# Altium footprint library ZS-005.PcbLib: 30 footprints (part 1 of 2)
Each footprint in its own frame and in the unit in brackets; x right, y up, seen from the top. Pads: shape width x height; smd on the part's side, far side on the other; paste and mask are expansions set on the pad; w line width, h text height; cw(c..) or ccw(c..) is an arc to the next point about the centre after c.
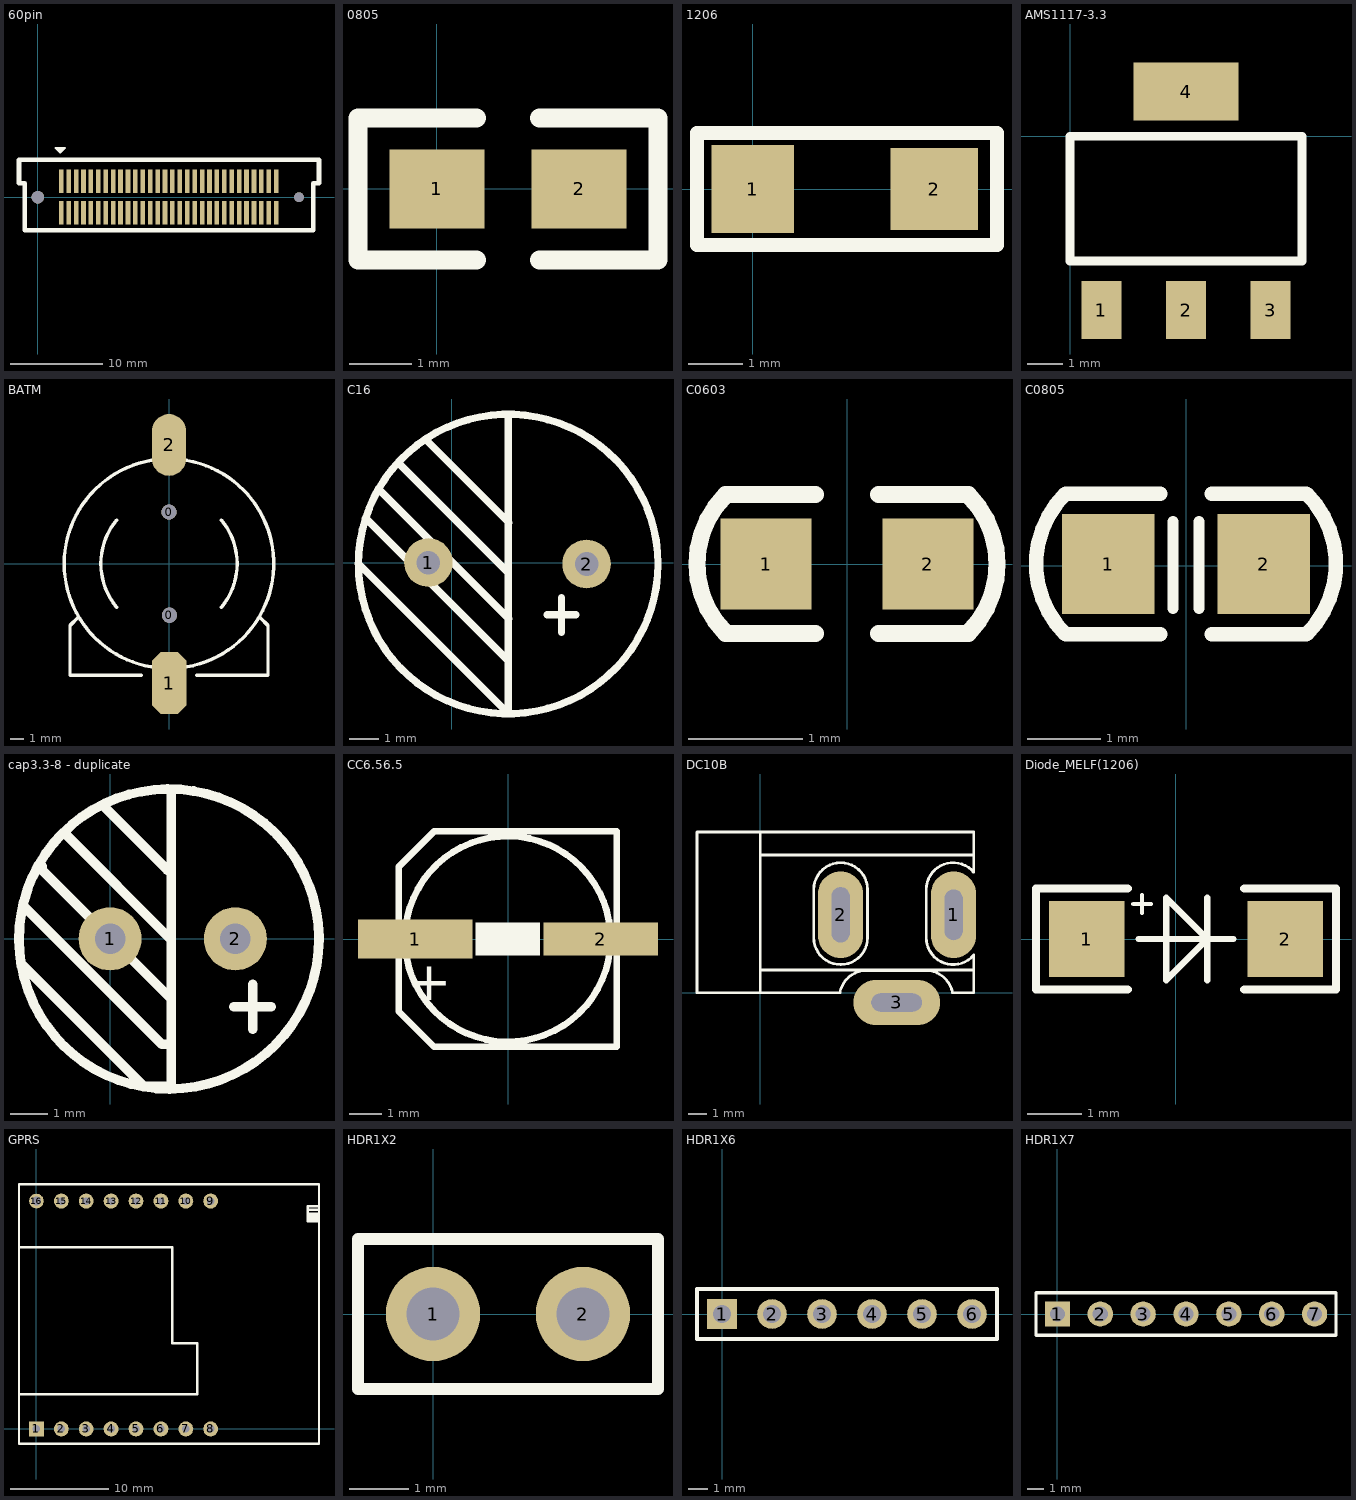
[diagram p0: the footprints below, top view; thin cyan lines are the x and y axes]

## 60pin [mm]
pads (62):
  rect 0.5x2.54 smd: 1(2.53,1.727) 2(3.33,1.727) 3(4.13,1.727) 4(4.93,1.727) 5(5.73,1.727) 6(6.53,1.727) 7(7.33,1.727) 8(8.13,1.727) 9(8.93,1.727) 10(9.73,1.727) 11(10.53,1.727) 12(11.33,1.727) 13(12.13,1.727) 14(12.93,1.727) 15(13.73,1.727) 16(14.53,1.727) 17(15.33,1.727) 18(16.13,1.727) 19(16.93,1.727) 20(17.73,1.727) 21(18.53,1.727) 22(19.33,1.727) 23(20.13,1.727) 24(20.93,1.727) 25(21.73,1.727) 26(22.53,1.727) 27(23.33,1.727) 28(24.13,1.727) 29(24.93,1.727) 30(25.73,1.727) 31(25.73,-1.65) 32(24.93,-1.65) 33(24.13,-1.65) 34(23.33,-1.65) 35(22.53,-1.65) 36(21.73,-1.65) 37(20.93,-1.65) 38(20.13,-1.65) 39(19.33,-1.65) 40(18.53,-1.65) 41(17.73,-1.65) 42(16.93,-1.65) 43(16.13,-1.65) 44(15.33,-1.65) 45(14.53,-1.65) 46(13.73,-1.65) 47(12.93,-1.65) 48(12.13,-1.65) 49(11.33,-1.65) 50(10.53,-1.65) 51(9.73,-1.65) 52(8.93,-1.65) 53(8.13,-1.65) 54(7.33,-1.65) 55(6.53,-1.65) 56(5.73,-1.65) 57(4.93,-1.65) 58(4.13,-1.65) 59(3.33,-1.65) 60(2.53,-1.65)
  round 1.35 hole 1.35: ""(0,0)
  round 1.05 hole 1.05: ""(28.194,0)
Top Overlay:
  lines w0.2: 1.88,5.334 2.413,4.801 2.946,5.334 1.88,5.334
  lines w0.254: 2.553,5.042 2.324,5.042 2.172,5.194 2.68,5.194
  lines w0.5: -2.032,1.524 -1.397,1.524 -1.397,-3.556 29.718,-3.556 29.718,1.524 30.353,1.524 30.353,4.064 27.178,4.064 1.143,4.064 -2.032,4.064 -2.032,1.524

## 0805 [mil]
pads (2):
  rect 60x50 smd: 1(0,-0.06) 2(90,-0.06)
Top Overlay:
  lines w12: 25,-45.06 -50,-45.06 -50,44.94 25,44.94 ; 65,-45.06 140,-45.06 140,44.94 65,44.94

## 1206 [mm]
pads (2):
  rect 1.5x1.6 smd: 1(0,0)
  rect 1.6x1.5 smd: 2(3.302,0)
Top Overlay:
  lines w0.254: -1.016,-1.016 -1.016,1.016 4.445,1.016 4.445,-1.016 -1.016,-1.016

## AMS1117-3.3 [mm]
pads (4):
  rect 1.14x1.65 smd: 1(0.889,-4.953) 2(3.302,-4.953) 3(5.715,-4.953)
  rect 3x1.65 smd: 4(3.302,1.27)
Top Overlay:
  lines w0.254: 0,-3.556 0,0 6.604,0 6.604,-3.556 0,-3.556

## BATM [mm]
pads (4):
  round 1.1 hole 1.1 unplated: 0(0,3.748) 0(0.025,-3.752)
  oct 2.5x4.5 smd: 1(0.025,-8.687)
  oval 2.5x4.5 smd: 2(0,8.636)
Top Overlay:
  lines w0.25: -6.6,-3.902 -7.2,-4.502 -7.2,-8.128 -2,-8.128 ; -3.815,-3.171 cw(c0,-0.002) -3.812,3.171 ; -0.833,-7.576 cw(c0,-0.002) -7.62,-0.002 cw(c0,-0.002) -0.833,7.573 ; 0.833,-7.576 ccw(c0,-0.002) 0.833,7.573 ; 2,-8.128 7.2,-8.128 7.2,-4.502 6.625,-3.927 ; 3.81,-3.177 ccw(c0,-0.002) 3.812,3.171
3D body "User Library-cr1220.STEP": height 4.44, standoff -0.5, extent -7.493,-9.504 7.504,8.996

## C16 [mil]
pads (2):
  round 66 hole 32: 1(-31.5,0) 2(183.07,-1.97)
Top Overlay:
  circle w10: c76.77,-1.97 r203.15
  lines w10: -126.97,-0.98 76.77,-204.72 76.77,-13.77 ; -115.6,59.6 76.33,-132.33 ; -97.93,98.93 77.27,-76.27 ; -69.88,132.88 76.77,-13.77 ; -33.41,165.41 77.81,54.19 ; 76.77,198.82 76.77,144.23 76.77,-13.77 ; 129.31,-71 168.69,-71 ; 149,-47.38 149,-94.62 149,-71 152.94,-71

## C0603 [mm]
pads (2):
  rect 0.8x0.8 smd: 1(-0.711,0) 2(0.711,0)
Top Overlay:
  lines w0.15: -0.279,-0.61 -1.067,-0.61 cw(c-0.457,0) -1.067,0.61 -0.279,0.61 ; 0.279,-0.61 1.067,-0.61 ccw(c0.457,0) 1.067,0.61 0.279,0.61
3D body "0603_C.step": height 0.88, standoff 0, extent -0.8,-0.406 0.8,0.404

## C0805 [mil]
pads (2):
  rect 50x54 smd: 1(-42,1) 2(42,1)
Top Overlay:
  lines w5.91: -7,-23 -7,24 ; 7,-23 7,24
  lines w7.87: -14,-37 -65,-37 cw(c-27.91,1) -65,39 -14,39 ; 14,-37 65,-37 ccw(c27.91,1) 65,39 14,39
3D body "C0805.STEP": height 19.68, standoff 0, extent -39,-24 39.74,25.21

## cap3.3-8 - duplicate [mil]
pads (2):
  round 66 hole 32: 1(0,0) 2(131.05,0)
Top Overlay:
  lines w10: -92,-27 35,-154 64,-154 64,-1 ; -89,33 54,-110 64,-110 ; -71,76 -71,72 64,-63 ; -47,111 -47,110 64,-1 ; -8,140 60,72 64,72 ; 65,156 64,155 64,-1 ; 129.31,-71 168.69,-71 ; 149,-47.38 149,-94.62 149,-71 152.94,-71 ; 218.47,1.94 ccw(c61.64,-0.14) 218.49,-0.14

## CC6.56.5 [mm]
pads (2):
  rect 3.5x1.2 smd: 1(-2.845,0)
  rect 3.5x1 smd: 2(2.845,0)
Top Overlay:
  rectangle: -0.997,-0.496 0.987,0.5
  lines w0.2: -3.353,-2.21 -2.257,-3.305 3.327,-3.305 3.327,3.309 -2.254,3.309 -3.353,2.21 -3.353,-2.21
  lines w0.203: 2.924,1.156 ccw(c-0.007,0.002) 2.924,1.154
  text "+" at -1.727,-1.88 h1.2
3D body "SL-E.step": height 5.2, standoff 0, extent -3.627,-3.046 3.373,3.554

## DC10B [mm]
pads (3):
  oval 2.5x4.8 hole 1 slot 2.794 at 90 deg: 1(10.693,4.318)
  oval 2.5x4.8 hole 1 slot 3.048 at 90 deg: 2(4.445,4.318)
  oval 4.8x2.5 hole 1 slot 2.794 at 0 deg: 3(7.544,-0.533)
Top Overlay:
  lines w0.152: 0,1.27 11.811,1.27 ; 0,7.62 11.687,7.62 11.792,7.62 ; 0.127,8.89 -0.381,8.89 -3.5,8.89 -3.5,0 0,0 ; 4.293,0 0,0 ; 4.403,0.004 cw(c5.867,-0.254) 5.867,1.232 9.169,1.232 cw(c9.169,-0.254) 10.633,0.004 ; 10.668,0 11.811,0 11.811,2.032 ; 11.807,2.093 cw(c10.668,3.048) 9.182,3.048 9.181,5.715 cw(c10.668,5.715) 11.807,6.67 11.811,8.89 0,8.89 0,0 ; 5.931,5.715 ccw(c4.445,5.715) 2.959,5.715 2.958,3.048 ccw(c4.445,3.048) 5.931,3.048 5.931,5.715 ; 5.931,5.715 5.932,5.715
3D body "User Library-dc range - dc connector[4840_2201].STEP": height 11.02, standoff -3.48, extent -3.038,-0.685 10.788,8.821

## Diode_MELF(1206) [mm]
pads (2):
  rect 1.4x1.4 smd: 1(-1.651,0) 2(2.032,0)
Top Overlay:
  lines w0.076: -0.787,0.648 -0.457,0.648 ; -0.622,0.483 -0.622,0.813
  lines w0.12: -0.686,0 1.067,0 ; 0.584,-0.762 0.584,0.762 ; -0.178,-0.762 0.584,0 -0.178,0.762 -0.178,-0.762
  lines w0.15: -0.889,-0.94 -2.591,-0.94 -2.591,0.94 -0.889,0.94 ; 1.27,-0.94 2.972,-0.94 2.972,0.94 1.27,0.94
3D body "Diode MELF.STEP": height 1.51, standoff 0.01, extent -1.496,-0.75 2.004,0.75

## GPRS [mil]
pads (16):
  rect 60x60 hole 30: 1(0,0)
  round 60 hole 30: 2(100,0) 3(200,0) 4(300,0) 5(400,0) 6(500,0) 7(600,0) 8(700,0) 9(700,915.35) 10(600,915.35) 11(500,915.35) 12(400,915.35) 13(300,915.35) 14(200,915.35) 15(100,915.35)
  round 59.06 hole 35.43: 16(0,915.35)
Top Layer:
  lines w10: 0,0 0,10
Top Overlay:
  lines w10: -70,-60 -70,983.31 ; -70,140 645,140 645,345 545,345 545,730 -70,730 ; -69.72,-60 1135,-60 1135,983.31 -69.72,983.31 ; 1090,845 1135,845 ; 1090,855 1130,855 ; 1090,880 1130,880 ; 1130,865 1090,865 1090,895 ; 1135,885 1135,835 1090,835 1090,895 ; 1135,895 1090,895
3D body "User Library-SIM800C-1.STEP": height 97.38, standoff 5.26, extent -55,130.94 637.92,749.06

## HDR1X2 [mm]
pads (2):
  round 1.6 hole 0.9: 1(0,0) 2(2.54,0)
Top Overlay:
  lines w0.2: -1.27,-1.27 -1.27,1.27 3.81,1.27 3.81,-1.27 -1.27,-1.27
3D body "1001-2.STEP": height 8.54, standoff -3, extent -1.27,-1.27 3.81,1.27

## HDR1X6 [mm] "Connector; Header; 6 Position"
pads (6):
  rect 1.5x1.5 hole 0.9: 1(0,0)
  round 1.5 hole 0.9: 2(2.54,0) 3(5.08,0) 4(7.62,0) 5(10.16,0) 6(12.7,0)
Top Overlay:
  lines w0.2: -1.27,-1.27 -1.27,1.27 13.97,1.27 13.97,-1.27 -1.27,-1.27
3D body "User Library-ESP07-1.STEP": height 3.5, standoff -0.01, extent -1.712,-1.224 14.288,20.776

## HDR1X7 [mm] "Connector; Header; 7 Position"
pads (7):
  rect 1.5x1.5 hole 0.9: 1(0,0)
  round 1.5 hole 0.9: 2(2.54,0) 3(5.08,0) 4(7.62,0) 5(10.16,0) 6(12.7,0) 7(15.24,0)
Top Overlay:
  lines w0.2: -1.27,-1.27 16.51,-1.27 16.51,1.27 -1.27,1.27 -1.27,-1.27
3D body "User Library-APC_220_1.STEP": height 71, standoff 5, extent -1.176,-1.27 16.162,58.73